# Altium footprint library Hare_Library.PcbLib: 252 footprints (part 7 of 16)
Each footprint in its own frame and in the unit in brackets; x right, y up, seen from the top. Pads: shape width x height; smd on the part's side, far side on the other; paste and mask are expansions set on the pad; w line width, h text height; cw(c..) or ccw(c..) is an arc to the next point about the centre after c.
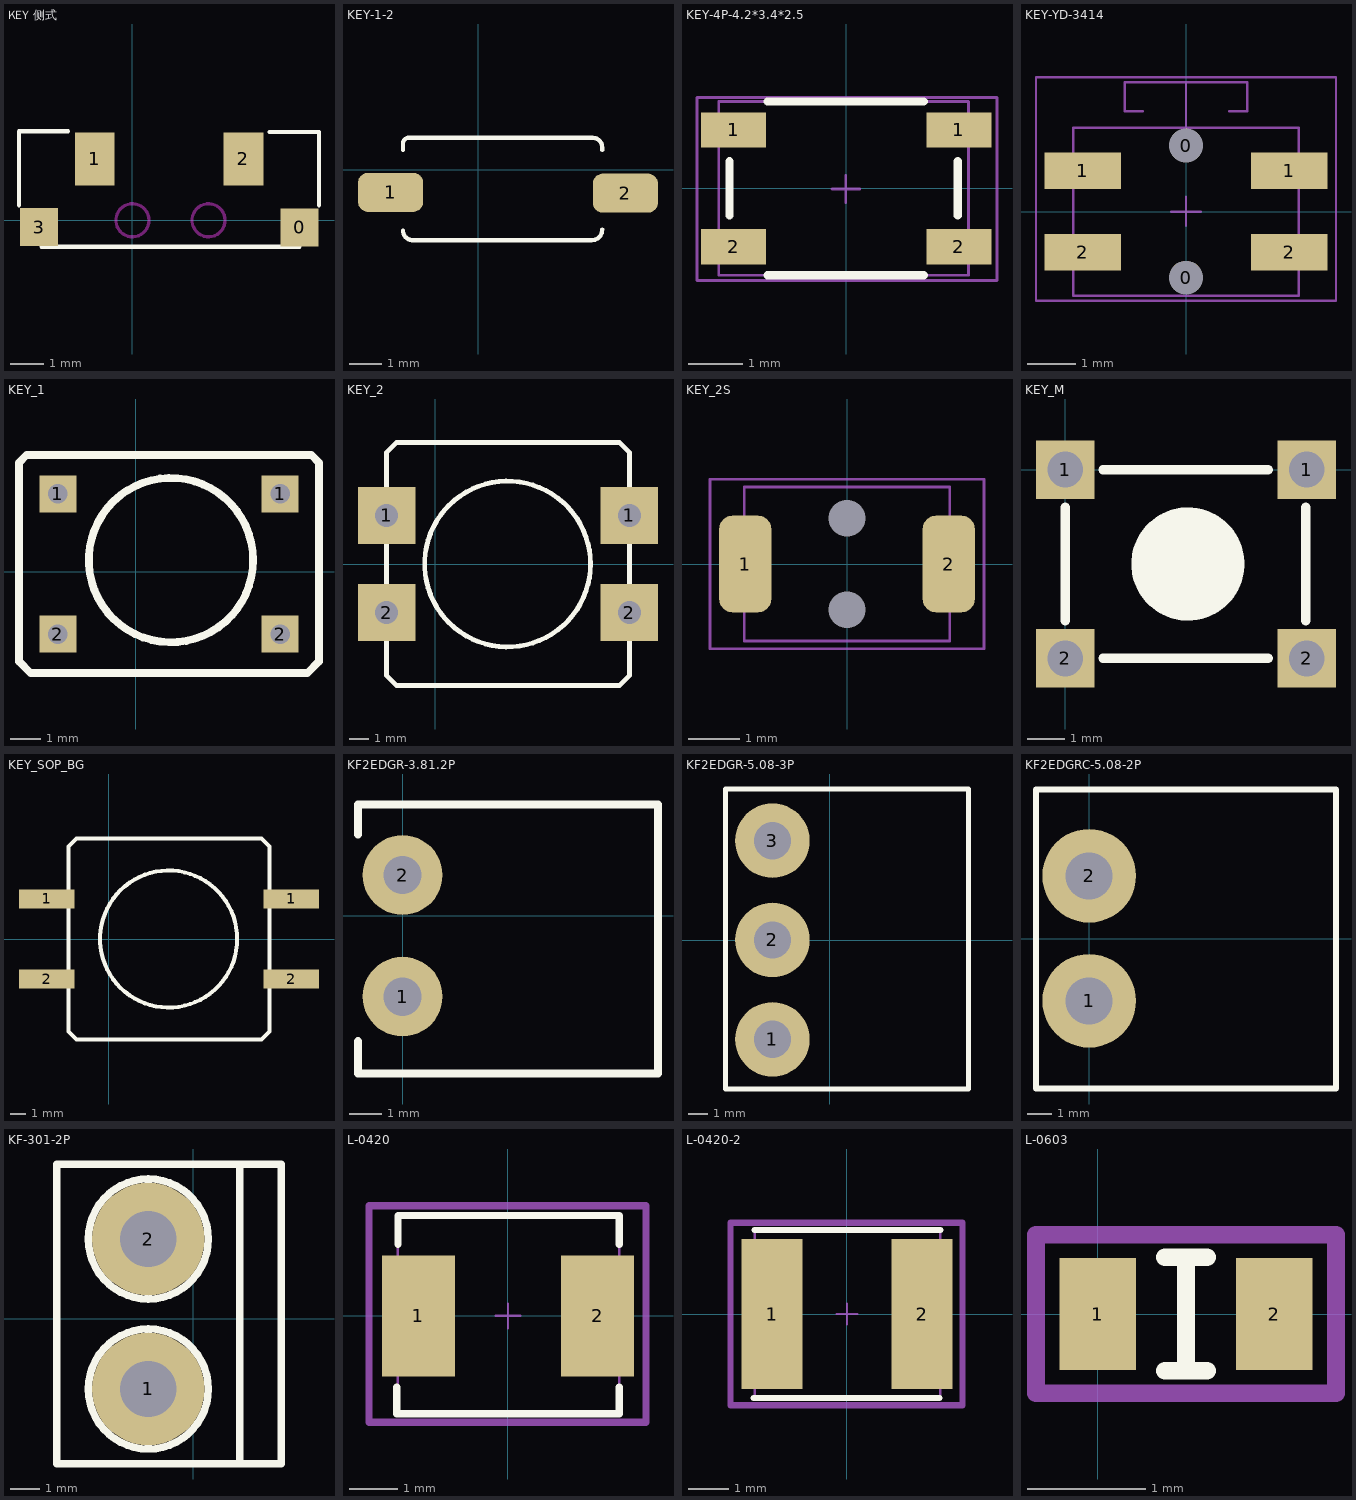
[diagram p6: the footprints below, top view; thin cyan lines are the x and y axes]

## KEY 侧式 [mm] "按键 贴片 侧式"
pads (4):
  rect 1.15x1.15 smd: 0(5.05,-0.216) 3(-2.819,-0.203)
  rect 1.2x1.6 smd: 1(-1.142,1.854) 2(3.354,1.854)
Top Overlay:
  lines w0.127: -3.429,0.457 -3.429,2.692 -1.948,2.692 ; -2.75,-0.8 5.05,-0.8 ; 4.14,2.667 5.639,2.667 5.639,0.457
Keep-Out Layer:
  circle w0.1: c0,0 r0.5
  circle w0.1: c2.3,0 r0.5

## KEY-1-2 [mm]
pads (2):
  rrect50% 2x1.2 smd: 1(-2.692,-0.699) 2(4.521,-0.724)
Top Overlay:
  lines w0.127: -2.311,-1.867 ccw(c-2.007,-1.867) -2.007,-2.172 ; -2.311,0.597 -2.311,0.8 cw(c-2.134,0.8) -2.134,0.978 3.505,0.978 cw(c3.505,0.673) 3.81,0.673 3.81,0.597 ; -2.032,-2.172 3.48,-2.172 ccw(c3.48,-1.841) 3.81,-1.841
3D body "User Library-KEY_SOT_P2.SLDPRT": height 2.36, standoff -0.03, extent -3.206,-2.406 4.934,1.194

## KEY-4P-4.2*3.4*2.5 [mm] "SKRPABE010"
pads (4):
  rect 1.2x0.65 smd: 1(-2.075,1.075) 1(2.075,1.075) 2(-2.075,-1.075) 2(2.075,-1.075)
Top Overlay:
  lines w0.152: -2.15,-0.5 -2.15,0.5 ; -1.45,-1.6 1.425,-1.6 ; -1.45,1.6 1.425,1.6 ; 2.05,-0.5 2.05,0.5
Mechanical 13:
  lines w0.051: -0.263,-0.011 0.245,-0.011 ; -0.009,-0.265 -0.009,0.243 ; -2.35,-1.6 -2.35,1.6 2.25,1.6 2.25,-1.6 -2.35,-1.6
Mechanical 14:
  lines w0.051: -2.75,-1.7 -2.75,1.675 2.775,1.675 2.775,-1.7 -2.75,-1.7
3D body "SKRPABE010.STEP": height 2.5, standoff 0, extent -2.35,-1.6 2.25,1.6

## KEY-YD-3414 [mm]
pads (6):
  round 0.7 hole 0.7 mask+0: 0(0,-1.375) 0(0,1.375)
  rect 1.6x0.762 smd: 1(-2.15,0.85) 1(2.15,0.85) 2(-2.15,-0.85) 2(2.15,-0.85)
Mechanical 13:
  lines w0.051: -0.899,2.089 -1.28,2.089 -1.28,2.689 1.28,2.689 1.28,2.089 0.899,2.089 ; -0.305,0 0.305,0 ; 0,-0.293 0,0.305 ; 0,1.739 0,2.689 ; -2.35,-1.75 -2.35,1.75 2.35,1.75 2.35,-1.75 -2.35,-1.75
Mechanical 14:
  lines w0.051: -3.124,-1.854 -3.124,2.794 3.124,2.794 3.124,-1.854 -3.124,-1.854
3D body "User Library-KMS231G.STEP": height 1.42, standoff -0.02, extent -2.339,-1.775 2.261,1.775

## KEY_1 [mm] "KEY?"
height 5
pads (4):
  rect 1.2x1.2 hole 0.635: 1(-2.54,2.54) 1(4.699,2.54) 2(-2.54,-2.032) 2(4.699,-2.032)
Top Overlay:
  circle w0.254: c1.143,0.381 r2.679
  lines w0.254: -3.81,3.048 -3.81,3.556 -3.556,3.81 ; -3.81,3.302 -3.81,-2.921 -3.429,-3.302 5.588,-3.302 5.969,-2.921 5.969,3.556 5.715,3.81 -3.556,3.81 ; -2.921,3.81 -3.556,3.81

## KEY_2 [mm] "KEY?"
pads (4):
  rect 3x3 hole 1.2: 1(-2.54,2.54) 1(10.16,2.54) 2(-2.54,-2.54) 2(10.16,-2.54)
Top Overlay:
  circle w0.254: c3.788,0 r4.34
  lines w0.254: 7.747,6.35 9.652,6.35 10.16,5.842 10.16,-5.842 9.652,-6.35 -2.032,-6.35 -2.54,-5.842 -2.54,5.842 -2.032,6.35 0.127,6.35 8.509,6.35

## KEY_2S [mil]
height 78.74
pads (4):
  round 0 hole 28: 0(0,-35) 0(0,35)
  rrect50% 40x74 smd: 1(-78,0) 2(78,0)
Mechanical 13:
  lines w2: -78.74,-59.06 -78.74,59.06 78.74,59.06 78.75,-59.05 -78.73,-59.05
Mechanical 14:
  lines w2: -105,-65 105,-65 105,65 -105,65 -105,-65
3D body "20041.stp": height 62.99, standoff 0, extent -78.73,-49.2 78.75,49.22

## KEY_M [mil] "KEY_MID"
pads (4):
  rect 62x62 hole 38: 1(0,0) 1(255.91,0) 2(0,-200) 2(255.91,-200)
Top Overlay:
  circle w60: c130,-100 r30
  lines w10: -0.03,-160 -0.03,-40 ; 39.97,-200 215,-200 ; 39.97,0 215,0 ; 255,-160 255,-40

## KEY_SOP_BG [mm] "KEY?"
height 5
pads (4):
  rect 3.5x1.2 smd: 1(-3.937,2.54) 1(11.557,2.54) 2(-3.937,-2.54) 2(11.557,-2.54)
Top Overlay:
  circle w0.254: c3.788,0 r4.34
  lines w0.254: 7.747,6.35 9.652,6.35 10.16,5.842 10.16,-5.842 9.652,-6.35 -2.032,-6.35 -2.54,-5.842 -2.54,5.842 -2.032,6.35 0.127,6.35 8.509,6.35

## KF2EDGR-3.81.2P [mm]
pads (2):
  round 2.5 hole 1.2: 1(0,-2.54) 2(0,1.27)
Top Overlay:
  lines w0.254: -1.397,-3.937 -1.397,-4.953 8.001,-4.953 8.001,3.484 -1.397,3.484 -1.397,2.54 ; 0,0.508 0,0.889
3D body "KF2EDGR-3.81-2P.stp": height 7.1, standoff -3.17, extent -1.298,-4.826 7.902,3.484

## KF2EDGR-5.08-3P [mil]
pads (3):
  round 150 hole 75: 1(-115,-199) 2(-115,1) 3(-115,201)
Top Overlay:
  lines w10: -210,-299 280,-299 280,305 -210,305 -210,-299
3D body "User Library-MSTB 2,5-3-G-5,08 1759020.STEP": height 338.58, standoff -137.8, extent -195,-300 277.53,300

## KF2EDGRC-5.08-2P [mil]
pads (2):
  round 150 hole 75: 1(0,-99) 2(0,101)
Top Overlay:
  lines w10: -85,-239.37 395,-239.37 395,239.36 -85,239.36 -85,-239.37
3D body "14043.step": height 322.83, standoff -153.54, extent -80,-239.37 392.53,239.37

## KF-301-2P [mil]
pads (2):
  round 150 hole 75: 1(-60,-94) 2(-60,106)
Top Overlay:
  circle w10: c-60,-94 r80
  circle w10: c-60,106 r80
  lines w10: -60,-174 -60,-159 ; -60,-29 -60,-14 ; -60,26 -60,41 ; -60,171 -60,186 ; 62.05,-194 62.05,206 ; -182.05,-194 117.17,-194 117.17,206 -182.05,206 -182.05,-194
3D body "User Library-Terminal-Screw-3A-2way.SLDPRT": height 393.7, standoff -118.11, extent -181.61,-203.84 117.61,213.48

## L-0420 [mm] "4.1*4.6*2MM(长*宽*高)"
pads (2):
  rect 1.5x2.5 smd: 1(-1.85,0) 2(1.85,0)
Top Overlay:
  lines w0.15: -2.3,-1.475 -2.3,-2.025 -1.775,-2.025 1.75,-2.025 2.3,-2.025 2.3,-1.475 ; -2.275,1.475 -2.275,2.075 -1.675,2.075 1.675,2.075 2.3,2.075 ; 2.3,1.475 2.3,2.075 ; 2.3,2.075 2.3,2.075
Mechanical 13:
  lines w0.051: -0.254,0 0.254,0 ; 0,-0.254 0,0.254 ; -2.275,-2.025 -2.275,2.075 2.3,2.075 2.3,-2.025 -2.275,-2.025
Mechanical 14:
  lines w0.15: -2.875,-2.2 -2.875,2.275 2.85,2.275 2.85,-2.2 -2.875,-2.2
3D body: height 2, standoff 0, extent -2.275,-2.025 2.3,2.075

## L-0420-2 [mm] "4.1*4.6*2MM(长*宽*高)"
pads (2):
  rect 1.5x3.7 smd: 1(-1.85,0) 2(1.85,0)
Top Overlay:
  lines w0.15: -2.3,-2.075 2.275,-2.075 ; -2.275,2.075 2.3,2.075 ; 2.3,2.075 2.3,2.075
Mechanical 13:
  lines w0.051: -0.254,0 0.254,0 ; 0,-0.254 0,0.254 ; -2.275,-2.025 -2.275,2.075 2.3,2.075 2.3,-2.025 -2.275,-2.025
Mechanical 14:
  lines w0.15: -2.875,-2.25 -2.875,2.25 2.85,2.25 2.85,-2.25 -2.875,-2.25
3D body: height 2, standoff 0, extent -2.275,-2.025 2.3,2.075

## L-0603 [mm]
height 0.35
pads (2):
  rect 0.65x0.95 smd: 1(0,0) 2(1.5,0)
Top Overlay:
  lines w0.152: 0.572,-0.483 0.928,-0.483 ; 0.572,0.483 0.928,0.483 ; 0.75,-0.483 0.75,0.483
Mechanical 15:
  lines w0.15: -0.525,-0.675 2.025,-0.675 2.025,0.675 -0.525,0.675 -0.525,-0.675
3D body "0603-res.step": height 0.35, standoff 0, extent -0.125,-0.475 1.625,0.475